# Altium footprint library Altium_Lib.PcbLib: 334 footprints (part 3 of 21)
Each footprint in its own frame and in the unit in brackets; x right, y up, seen from the top. Pads: shape width x height; smd on the part's side, far side on the other; paste and mask are expansions set on the pad; w line width, h text height; cw(c..) or ccw(c..) is an arc to the next point about the centre after c.
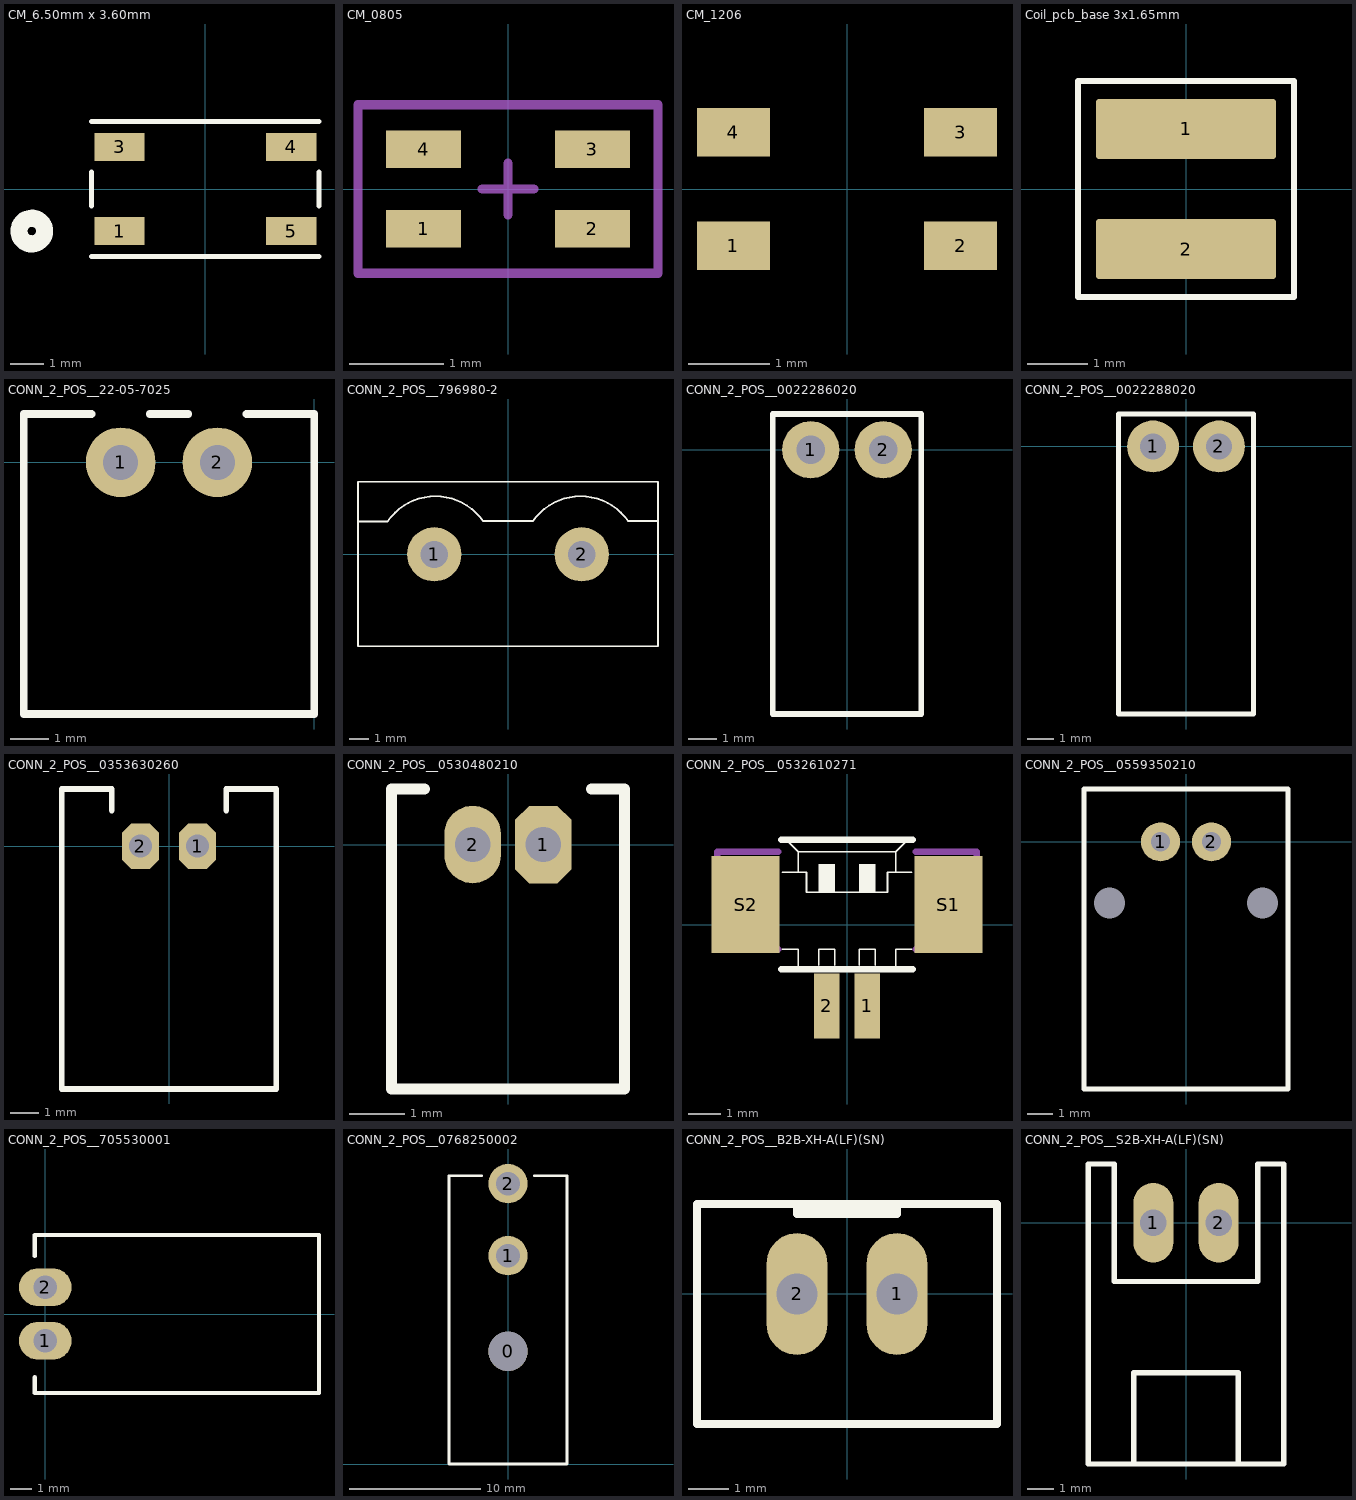
[diagram p2: the footprints below, top view; thin cyan lines are the x and y axes]

## CM_6.50mm x 3.60mm [mm]
pads (4):
  rect 1.499x0.838 smd: 1(-2.55,-1.25) 3(-2.55,1.25) 4(2.55,1.25) 5(2.55,-1.25)
Top Overlay:
  circle w0.508: c-5.156,-1.25 r0.381
  lines w0.152: -3.378,-2.007 3.378,-2.007 ; -3.378,-0.508 -3.378,0.508 ; -3.378,2.007 3.378,2.007 ; 3.378,-0.508 3.378,0.508
Bottom Overlay:
  circle w0.508: c-5.156,-1.25 r0.381
3D body "744212100_Download_STP_WE-SL1_rev1.stp": height 1.5, standoff -0.16, extent -2.6,-1.8 2.6,1.8

## CM_0805 [mm]
height 0.6
pads (4):
  rect 0.8x0.4 smd mask+0.102: 1(-0.9,-0.425) 2(0.9,-0.425) 3(0.9,0.425) 4(-0.9,0.425)
Mechanical 15:
  lines w0.1: -0.275,0 0.275,0 ; 0,-0.275 0,0.275 ; -1.6,-0.9 -1.6,0.9 1.6,0.9 1.6,-0.9 -1.6,-0.9
3D body "CM_0805.stp": height 1.19, standoff -0.01, extent -1,-0.6 1,0.6

## CM_1206 [mm]
height 0.6
pads (4):
  rect 0.9x0.6 smd mask+0.102: 1(-1.4,-0.7) 2(1.4,-0.7) 3(1.4,0.7) 4(-1.4,0.7)
3D body "srf3216.stp": height 2, standoff 0, extent -1.6,-0.8 1.6,0.8

## Coil_pcb_base 3x1.65mm [mm]
height 2.03
pads (2):
  rrect10% 3x1 smd paste-3: 1(0,1) 2(0,-1)
Top Overlay:
  lines w0.1: -1.8,-1.8 1.8,-1.8 1.8,1.8 -1.8,1.8 -1.8,-1.8

## CONN_2_POS__22-05-7025 [mm]
pads (2):
  round 1.8 hole 0.9: 1(-5,0) 2(-2.5,0)
Top Overlay:
  lines w0.2: -5.75,1.25 -7.5,1.25 -7.5,-6.5 0,-6.5 0,1.25 -1.75,1.25 ; -4.25,1.25 -3.25,1.25
3D body "022057025.stp": height 4.95, standoff -3.45, extent -7.45,-6.7 -0.05,1.2

## CONN_2_POS__796980-2 [mm]
pads (2):
  round 2.8 hole 1.4: 1(-3.81,0) 2(3.81,0)
Top Overlay:
  lines w0.1: -7.75,1.7 -6.225,1.7 ; -6.208,1.72 cw(c-3.75,0) -1.292,1.72 ; -1.3,1.725 1.275,1.725 ; 1.292,1.72 cw(c3.75,0) 6.208,1.72 ; 6.225,1.725 7.725,1.725 ; -7.75,-4.75 7.75,-4.75 7.75,3.75 -7.75,3.75 -7.75,-4.75
3D body "691311400102_Download_STP_691311400102_rev1.stp": height 12.1, standoff -3.9, extent -7.62,-4.7 7.62,3.8

## CONN_2_POS__0022286020 [mm]
pads (2):
  round 2 hole 1: 1(-1.27,0) 2(1.27,0)
Top Overlay:
  lines w0.2: -2.6,-9.25 2.6,-9.25 2.6,1.25 -2.6,1.25 -2.6,-9.25
3D body "022286020.stp": height 3.99, standoff -3.37, extent -2.54,-9.169 2.54,1.245

## CONN_2_POS__0022288020 [mm]
pads (2):
  round 2 hole 1: 1(-1.27,0) 2(1.27,0)
Top Overlay:
  lines w0.2: -2.6,-10.3 2.6,-10.3 2.6,1.25 -2.6,1.25 -2.6,-10.3
3D body "022288020.stp": height 3.24, standoff -2.67, extent -2.54,-10.241 2.54,0.351

## CONN_2_POS__0353630260 [mm]
pads (2):
  oct 1.3x1.6 hole 0.8: 1(1,0) 2(-1,0)
Top Overlay:
  lines w0.2: -2,1.25 -2,2 -3.75,2 -3.75,-8.5 3.75,-8.5 3.75,2 2,2 2,1.25
3D body "353630260.stp": height 5.55, standoff -3.15, extent -3.85,-8.5 3.85,2

## CONN_2_POS__0530480210 [mil]
pads (2):
  oct 40x55 hole 25: 1(25,0)
  oval 40x55 hole 25: 2(-25,0)
Top Overlay:
  lines w7.87: -59.06,39.37 -82.68,39.37 -82.68,-173.23 82.68,-173.23 82.68,39.37 59.06,39.37
3D body "530480210.stp": height 141.73, standoff -86.61, extent -83.66,-173.39 83.66,43.15

## CONN_2_POS__0532610271 [mm]
pads (4):
  rect 0.8x2 smd: 1(0.625,-2.5) 2(-0.625,-2.5)
  rect 2.1x3 smd: S1(3.125,0.625) S2(-3.125,0.625)
Top Overlay:
  rectangle: -0.875,1 -0.375,1.875
  rectangle: 0.375,1 0.875,1.875
  lines w0.051: -2,-0.75 -1.5,-0.75 -1.5,-1.375 ; -2,1.625 -1.5,1.625 ; -1.875,2.625 -1.5,2.25 ; -0.875,-1.25 -0.875,-0.75 -0.375,-0.75 -0.375,-1.25 ; 0.375,-1.25 0.375,-0.75 0.875,-0.75 0.875,-1.25 ; 1.5,-1.375 1.5,-0.75 2,-0.75 ; 1.875,2.625 1.5,2.25 ; 2,1.625 1.5,1.625 ; -1.5,1.625 -1.25,1.625 -1.25,1 1.25,1 1.25,1.625 1.5,1.625 ; -1.5,1.625 -1.5,2.25 ; -1.5,2.25 1.5,2.25 ; 1.5,1.625 1.5,2.25
  lines w0.203: -2.025,-1.375 -1.5,-1.375 1.5,-1.375 2.025,-1.375 ; -2.025,2.625 -1.875,2.625 1.875,2.625 2.025,2.625
Mechanical 16:
  lines w0.203: -2.125,-0.75 -4,-0.75 -4,2.25 -2.125,2.25 ; 2.125,-0.75 4,-0.75 4,2.25 2.125,2.25
  text "1" at 2.5,-0.25 h2.99
3D body "532610271.stp": height 3.45, standoff 0.05, extent -3.825,-2.5 3.825,2.7

## CONN_2_POS__0559350210 [mm]
pads (4):
  round 1.524 hole 0.762: 1(-1,0) 2(1,0)
  round 0 hole 1.2: 3(-3,-2.4) 3(3,-2.4)
Top Overlay:
  lines w0.203: -4,-9.695 4,-9.695 4,2.072 -4,2.072 -4,-9.695
3D body "559350210.stp": height 6.7, standoff -3.2, extent -3.986,-9.7 4.014,2.05

## CONN_2_POS__705530001 [mm]
pads (2):
  oval 2.5x1.8 hole 1.1 mask+0.076: 1(0,-1.27) 2(0,1.27)
Top Overlay:
  lines w0.2: -0.5,-3 -0.5,-3.75 13,-3.75 13,3.75 -0.5,3.75 -0.5,2.75
3D body "705530001.stp": height 7.06, standoff -3.22, extent -0.624,-3.683 12.965,3.683

## CONN_2_POS__0768250002 [mm]
pads (3):
  round 3 hole 3 unplated mask+0.05: 0(0,8.6)
  round 3 hole 1.8 mask+0.05: 1(0,15.9) 2(0,21.4)
Top Overlay:
  lines w0.2: -2,22 -4.5,22 -4.5,0 4.5,0 ; 2,22 4.5,22 4.5,0 ; 4.5,0 4.5,0
3D body "768250002.stp": height 15.25, standoff -2.88, extent -4.175,0 4.175,21.962

## CONN_2_POS__B2B-XH-A(LF)(SN) [mil]
pads (2):
  oval 60x120 hole 40: 1(49.21,0) 2(-49.21,0)
Top Overlay:
  lines w7.87: -49.21,83.66 49.21,83.66 ; -49.21,88.58 -49.21,78.74 -40,78.74 49.21,78.74 49.21,88.58 ; -147.64,-127.95 147.64,-127.95 147.64,88.58 -147.64,88.58 -147.64,-127.95
Mechanical 16:
  rectangle: -60,-10 -40,10
  rectangle: 40,-10 60,10
3D body "User Library-JST B2B-XH-A.STEP": height 283.46, standoff -125.98, extent -145.67,-132.88 145.67,93.51

## CONN_2_POS__S2B-XH-A(LF)(SN) [mil]
pads (2):
  oval 60x120 hole 40: 1(-49.21,0) 2(49.21,0)
Top Overlay:
  lines w7.87: -78.74,-364.17 -78.74,-226.38 78.74,-226.38 78.74,-364.17 ; -147.64,-364.17 147.64,-364.17 147.64,88.58 108.27,88.58 108.27,-88.58 -108.27,-88.58 -108.27,88.58 -147.64,88.58 -147.64,-364.17
Mechanical 16:
  rectangle: -60,-10 -40,10
  rectangle: 40,-10 60,10
3D body "User Library-S2B-XH-A-1.STEP": height 238.19, standoff -129.92, extent -147.64,-364.17 143.7,88.58